# Altium footprint library TriggersLib.PcbLib: 262 footprints (part 15 of 17)
Each footprint in its own frame and in the unit in brackets; x right, y up, seen from the top. Pads: shape width x height; smd on the part's side, far side on the other; paste and mask are expansions set on the pad; w line width, h text height; cw(c..) or ccw(c..) is an arc to the next point about the centre after c.
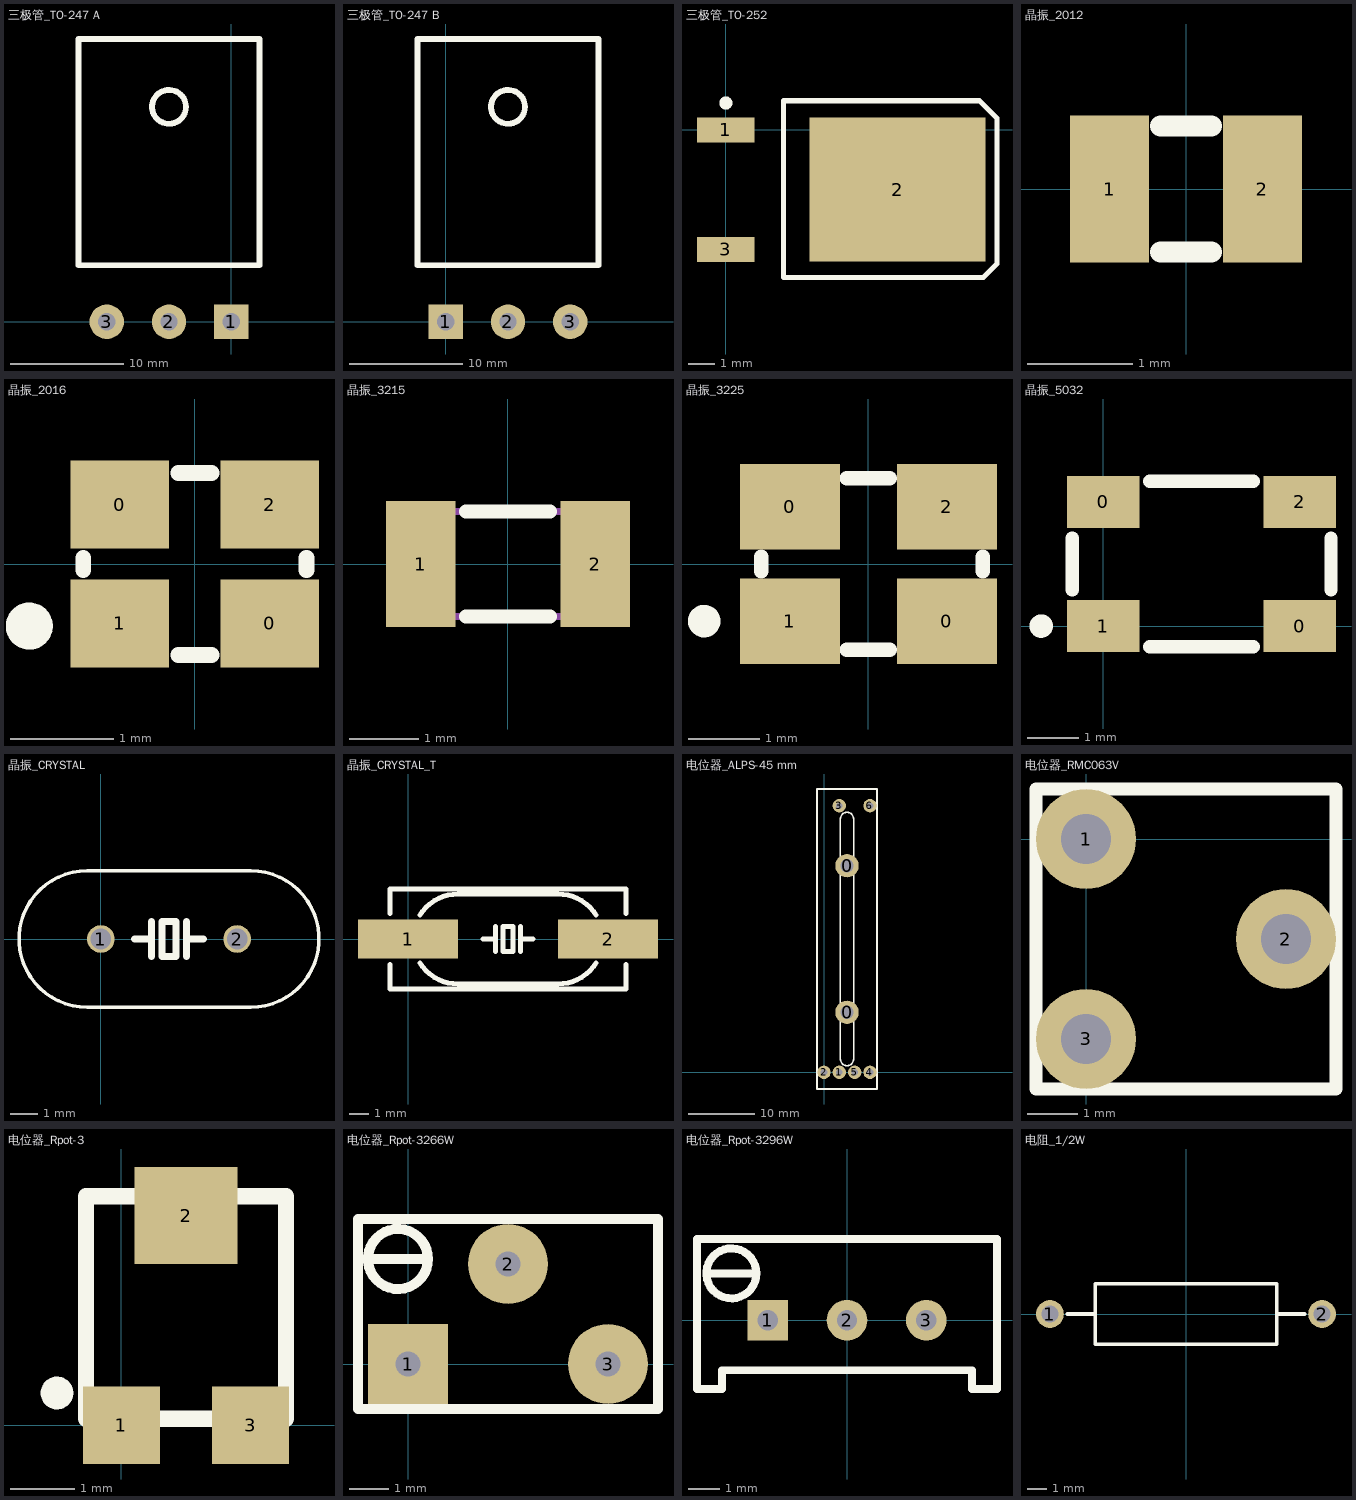
[diagram p14: the footprints below, top view; thin cyan lines are the x and y axes]

## 三极管_TO-247 A [mil]
pads (3):
  rect 120x120 hole 60: 1(0,0)
  round 120 hole 60: 2(-216.54,0) 3(-433.07,0)
Top Overlay:
  circle w20: c-216.54,748.03 r59.06
  lines w20: -531.5,196.85 98.43,196.85 98.43,984.25 -531.5,984.25 -531.5,196.85

## 三极管_TO-247 B [mil]
pads (3):
  rect 120x120 hole 60: 1(0,0)
  round 120 hole 60: 2(216.54,0) 3(433.07,0)
Top Overlay:
  circle w20: c216.54,748.03 r59.06
  lines w20: -98.43,196.85 -98.43,984.25 531.5,984.25 531.5,196.85 -98.43,196.85

## 三极管_TO-252 [mm]
height 2.38
pads (3):
  rect 2.2x0.95 smd: 1(0,0) 3(0,-4.56)
  rect 6.7x5.5 smd: 2(6.55,-2.28)
Top Overlay:
  circle w0.25: c0,1.025 r0.125
  lines w0.1: 2.2,-5.63 2.2,1.07
  lines w0.2: 2.2,-5.63 2.2,1.111 9.678,1.111 10.344,0.445 10.344,-5.104 9.818,-5.63 2.2,-5.63
3D body "D-PAK.STEP": height 2.31, standoff 0, extent -0.075,-5.58 9.175,1.02

## 晶振_2012 [mm]
pads (2):
  rect 0.75x1.4 smd: 1(-0.725,0) 2(0.725,0)
Top Overlay:
  lines w0.2: -0.24,-0.6 0.24,-0.6 ; -0.24,0.6 0.24,0.6
3D body: height 0.6, standoff 0.15, extent -0.825,-0.4 0.825,0.4
3D body "User Library-ABS06.STEP": height 0.6, standoff 0, extent -1,-0.61 1,0.61

## 晶振_2016 [mm]
pads (4):
  rect 0.95x0.85 smd: 0(-0.725,0.575) 0(0.725,-0.575) 1(-0.725,-0.575) 2(0.725,0.575)
Top Overlay:
  circle w0.254: c-1.6,-0.6 r0.1
  lines w0.152: -1.08,-0.06 -1.08,0.06 ; -0.16,-0.88 0.16,-0.88 ; -0.16,0.88 0.16,0.88 ; 1.08,-0.06 1.08,0.06
3D body "User Library-GeyerElectronics_KX5.step": height 0.56, standoff 0, extent -1.05,-0.85 1.05,0.85
3D body: height 0.56, standoff 0.15, extent -0.7,-0.65 0.7,0.65

## 晶振_3215 [mm] "XTAL SMD 3.2 x 1.5 mm"
height 0.8
pads (2):
  rect 1x1.8 smd: 1(-1.25,0) 2(1.25,0)
Top Overlay:
  lines w0.2: -0.6,-0.75 0.6,-0.75 ; -0.6,0.75 0.6,0.75
Mechanical 3:
  lines w0.1: -1.6,-0.55 cw(c-1.6,-0.75) -1.4,-0.75 1.4,-0.75 cw(c1.6,-0.75) 1.6,-0.55 1.6,0.55 cw(c1.6,0.75) 1.4,0.75 -1.4,0.75 cw(c-1.6,0.75) -1.6,0.55 -1.6,-0.55
3D body: height 0.81, standoff 0.15, extent -1.2,-0.6 1.2,0.6
3D body "User Library-Siward_SX3215.step": height 0.81, standoff 0, extent -1.6,-0.75 1.6,0.75

## 晶振_3225 [mm]
pads (4):
  rect 1.4x1.2 smd: 0(-1.1,0.8) 0(1.1,-0.8) 1(-1.1,-0.8) 2(1.1,0.8)
Top Overlay:
  circle w0.254: c-2.3,-0.8 r0.1
  lines w0.203: -1.5,-0.1 -1.5,0.1 ; -0.3,-1.2 0.3,-1.2 ; -0.3,1.2 0.3,1.2 ; 1.6,-0.1 1.6,0.1
3D body "XTAL-3225.STEP": height 0.8, standoff 0, extent -1.549,-1.268 1.651,1.232

## 晶振_5032 [mm]
pads (4):
  rect 1.4x1 smd: 0(0,2.4) 0(3.8,0) 1(0,0) 2(3.8,2.4)
Top Overlay:
  circle w0.254: c-1.2,0 r0.1
  lines w0.254: -0.6,0.7 -0.6,1.7 ; 0.9,-0.4 2.9,-0.4 ; 0.9,2.8 2.9,2.8 ; 4.4,0.7 4.4,1.7

## 晶振_CRYSTAL [mil]
pads (2):
  round 40 / inner round 70 / far side round 70 hole 30: 1(0,0) 2(196.85,0)
Top Overlay:
  lines w5: -19.69,-98.43 cw(c-19.68,0) -19.68,98.43 216.54,98.43 cw(c216.54,0) 216.54,-98.43 -19.68,-98.43
  lines w10: 48.43,0 73.43,0 ; 73.43,-25 73.43,25 ; 123.43,-25 123.43,25 ; 123.43,0 148.43,0 ; 88.43,-25 88.43,25 108.43,25 108.43,-25 88.43,-25

## 晶振_CRYSTAL_T [mm]
pads (2):
  rect 5.08x2 smd: 1(0,0) 2(10.16,0)
Top Overlay:
  lines w0.254: -0.92,-1.301 -0.92,-2.54 11.08,-2.54 11.08,-1.301 ; -0.92,1.301 -0.92,2.54 11.08,2.54 11.08,1.301 ; 0.601,-1.212 ccw(c2.54,0) 2.54,-2.286 7.62,-2.286 ccw(c7.62,0) 9.559,-1.212 ; 0.601,1.212 cw(c2.54,0) 2.54,2.286 7.62,2.286 cw(c7.62,0) 9.559,1.212 ; 3.81,0 4.445,0 ; 4.445,-0.635 4.445,0.635 ; 5.715,-0.635 5.715,0.635 ; 5.715,0 6.35,0 ; 4.826,-0.635 5.334,-0.635 5.334,0.635 4.826,0.635 4.826,-0.635

## 电位器_ALPS-45 mm [mm]
pads (8):
  round 3.5 hole 2: 0(3.45,9) 0(3.45,31)
  round 2 hole 1: 1(2.3,0) 2(0,0) 3(2.3,40) 4(6.9,0) 5(4.6,0) 6(6.9,40)
Top Overlay:
  lines w0.254: -1.05,-2.5 7.95,-2.5 7.95,42.5 -1.05,42.5 -1.05,-2.5 ; 2.45,2 ccw(c3.45,2) 4.45,2 4.45,38 ccw(c3.45,38) 2.45,38 2.45,2

## 电位器_RMC063V [mm]
pads (3):
  round 2 hole 1: 1(0,0) 2(4,-2) 3(0,-4)
Top Overlay:
  lines w0.254: -1,-5 -1,1 5,1 5,-5 -1,-5

## 电位器_Rpot-3 [mm]
pads (3):
  rect 1.2x1.2 smd: 1(0,0) 3(2,0)
  rect 1.6x1.5 smd: 2(1,3.25)
Top Overlay:
  circle w0.254: c-1,0.5 r0.127
  lines w0.254: -0.55,0.1 -0.55,3.55 2.55,3.55 2.55,0.1 -0.55,0.1

## 电位器_Rpot-3266W [mil]
pads (3):
  rect 80x80 hole 25: 1(0,0)
  round 80 hole 25: 2(100,100) 3(200,0)
Top Overlay:
  circle w10: c-10,105 r30
  lines w10: -40,105 20,105 ; -50,-45 -50,145 250,145 250,-45 -50,-45

## 电位器_Rpot-3296W [mm]
pads (3):
  rect 1.3x1.3 hole 0.65: 1(-2.54,0)
  round 1.3 hole 0.65: 2(0,0) 3(2.54,0)
Top Overlay:
  circle w0.254: c-3.7,1.5 r0.8
  lines w0.254: -4.5,1.5 -2.9,1.5 ; -4.8,-2.2 -4.8,2.6 4.8,2.6 4.8,-2.2 4,-2.2 4,-1.6 -4,-1.6 -4,-2.2 -4.8,-2.2
3D body "3296 pot.step": height 11.55, standoff -6.4, extent -4.765,-2.418 4.765,2.413

## 电阻_1/2W [mm]
height 2.54
pads (2):
  round 1.4 hole 0.85: 1(-6.858,0) 2(6.858,0)
Top Overlay:
  lines w0.2: -5.984,0 -4.572,0 ; 4.572,0 5.984,0 ; -4.572,-1.524 4.572,-1.524 4.572,1.524 -4.572,1.524 -4.572,-1.524